# Altium footprint library connector.PcbLib: 138 footprints (part 9 of 9)
Each footprint in its own frame and in the unit in brackets; x right, y up, seen from the top. Pads: shape width x height; smd on the part's side, far side on the other; paste and mask are expansions set on the pad; w line width, h text height; cw(c..) or ccw(c..) is an arc to the next point about the centre after c.
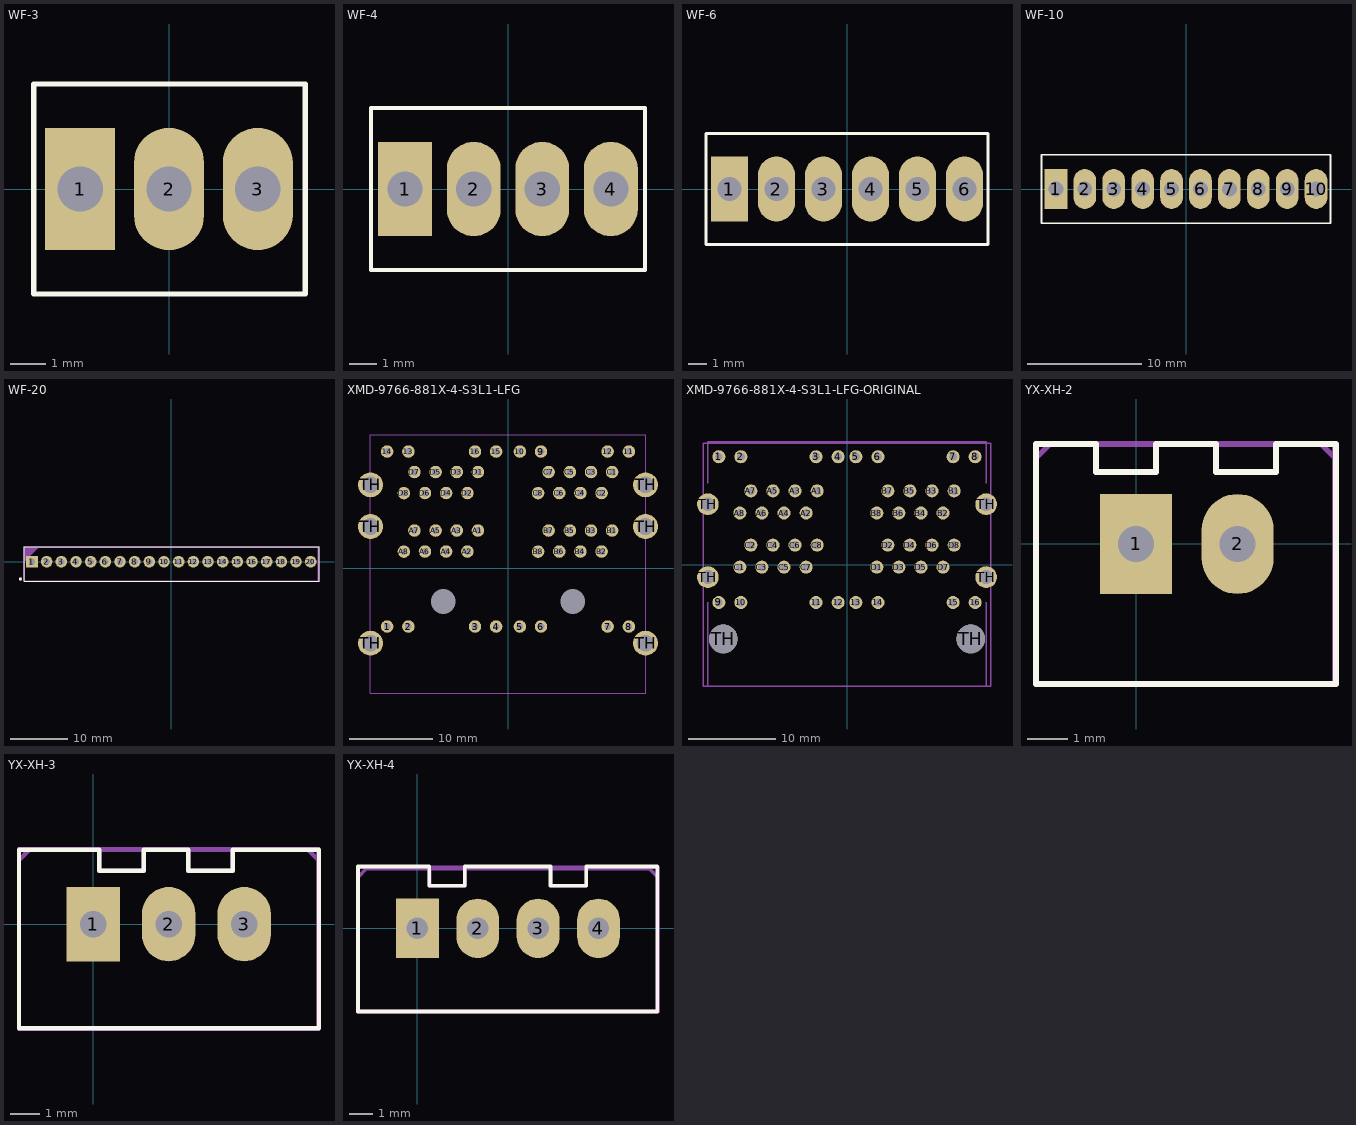
[diagram p8: the footprints below, top view; thin cyan lines are the x and y axes]

## WF-3 [mm]
pads (3):
  rect 2x3.5 hole 1.3: 1(-2.54,0)
  oval 2x3.5 hole 1.3: 2(0,0) 3(2.54,0)
Top Overlay:
  lines w0.15: -3.87,-3 3.9,-3 3.9,3 -3.87,3 -3.87,-3
3D body "SNP389.STEP": height 11.4, standoff -3.4, extent -3.81,-2.9 -1.27,2.9
3D body "SNP389.STEP": height 11.4, standoff -3.4, extent -1.27,-2.9 1.27,2.9
3D body "SNP389.STEP": height 11.4, standoff -3.4, extent 1.27,-2.9 3.81,2.9

## WF-4 [mm]
pads (4):
  rect 2x3.5 hole 1.3: 1(-3.81,0)
  oval 2x3.5 hole 1.3: 2(-1.27,0) 3(1.27,0) 4(3.81,0)
Top Overlay:
  lines w0.15: -5.08,-3 -5.08,3 5.08,3 5.08,-3 -5.08,-3
3D body "SNP389.STEP": height 11.4, standoff -3.4, extent 2.54,-2.9 5.08,2.9
3D body "SNP389.STEP": height 11.4, standoff -3.4, extent 0,-2.9 2.54,2.9
3D body "SNP389.STEP": height 11.4, standoff -3.4, extent -2.54,-2.9 0,2.9
3D body "SNP389.STEP": height 11.4, standoff -3.4, extent -5.08,-2.9 -2.54,2.9

## WF-6 [mm]
pads (6):
  rect 2x3.5 hole 1.3: 1(-6.35,0)
  oval 2x3.5 hole 1.3: 2(-3.81,0) 3(-1.27,0) 4(1.27,0) 5(3.81,0) 6(6.35,0)
Top Overlay:
  lines w0.15: -7.62,-3 7.62,-3 7.62,3 -7.62,3 -7.62,-3
3D body "SNP389.STEP": height 11.4, standoff -3.4, extent 5.08,-2.9 7.62,2.9
3D body "SNP389.STEP": height 11.4, standoff -3.4, extent 2.54,-2.9 5.08,2.9
3D body "SNP389.STEP": height 11.4, standoff -3.4, extent -7.62,-2.9 -5.08,2.9
3D body "SNP389.STEP": height 11.4, standoff -3.4, extent -5.08,-2.9 -2.54,2.9
3D body "SNP389.STEP": height 11.4, standoff -3.4, extent -2.54,-2.9 0,2.9
3D body "SNP389.STEP": height 11.4, standoff -3.4, extent 0,-2.9 2.54,2.9

## WF-10 [mm]
pads (10):
  rect 2x3.5 hole 1.3: 1(-11.43,0)
  oval 2x3.5 hole 1.3: 2(-8.89,0) 3(-6.35,0) 4(-3.81,0) 5(-1.27,0) 6(1.27,0) 7(3.81,0) 8(6.35,0) 9(8.89,0) 10(11.43,0)
Top Overlay:
  lines w0.15: -12.7,-3 -12.7,3 12.7,3 12.7,-3 -12.7,-3
3D body "SNP389.STEP": height 11.4, standoff -3.4, extent 10.16,-2.9 12.7,2.9
3D body "SNP389.STEP": height 11.4, standoff -3.4, extent 7.62,-2.9 10.16,2.9
3D body "SNP389.STEP": height 11.4, standoff -3.4, extent 5.08,-2.9 7.62,2.9
3D body "SNP389.STEP": height 11.4, standoff -3.4, extent 2.54,-2.9 5.08,2.9
3D body "SNP389.STEP": height 11.4, standoff -3.4, extent -5.08,-2.9 -2.54,2.9
3D body "SNP389.STEP": height 11.4, standoff -3.4, extent -7.62,-2.9 -5.08,2.9
3D body "SNP389.STEP": height 11.4, standoff -3.4, extent -10.16,-2.9 -7.62,2.9
3D body "SNP389.STEP": height 11.4, standoff -3.4, extent -12.7,-2.9 -10.16,2.9
3D body "SNP389.STEP": height 11.4, standoff -3.4, extent -2.54,-2.9 0,2.9
3D body "SNP389.STEP": height 11.4, standoff -3.4, extent 0,-2.9 2.54,2.9

## WF-20 [mm]
pads (22):
  round 0.5 on Top Overlay: 0(-26.13,-3)
  round 0.5 on Mech29: 0(-26.13,-3)
  rect 2x2 hole 1.1: 1(-24.13,0)
  round 2 hole 1.1: 2(-21.59,0) 3(-19.05,0) 4(-16.51,0) 5(-13.97,0) 6(-11.43,0) 7(-8.89,0) 8(-6.35,0) 9(-3.81,0) 10(-1.27,0) 11(1.27,0) 12(3.81,0) 13(6.35,0) 14(8.89,0) 15(11.43,0) 16(13.97,0) 17(16.51,0) 18(19.05,0) 19(21.59,0) 20(24.13,0)
Top Overlay:
  lines w0.15: -25.48,-3.4 -25.48,2.6 25.57,2.6 25.57,-3.4 -25.48,-3.4
Mechanical 1:
  lines w0.15: -25.37,-3.3 25.47,-3.3 25.47,2.5 -25.37,2.5 -25.37,-3.3
Mechanical 29:
  region: -25.48,2.6 -22.88,2.6 -25.48,0
  lines w0.15: -25.48,-3.4 25.57,-3.4 25.57,2.6 -25.48,2.6 -25.48,-3.4
  text ".Designator" at -3.5,-0.3 h1
3D body "WF-20.stp": height 11.51, standoff -3.29, extent -25.37,-3.3 25.47,2.5

## XMD-9766-881X-4-S3L1-LFG [mm]
pads (56):
  round 1.5 hole 0.8: 1(-14.5,-7) 2(-11.96,-7) 3(-3.96,-7) 4(-1.42,-7) 5(1.42,-7) 6(3.96,-7) 7(11.96,-7) 8(14.5,-7) 9(3.96,14) 10(1.42,14) 11(14.5,14) 12(11.96,14) 13(-11.96,14) 14(-14.5,14) 15(-1.42,14) 16(-3.96,14) A1(-3.61,4.52) A2(-4.88,2) A3(-6.15,4.52) A4(-7.42,2) A5(-8.69,4.52) A6(-9.96,2) A7(-11.23,4.52) A8(-12.5,1.98) B1(12.5,4.52) B2(11.23,2) B3(9.96,4.52) B4(8.69,2) B5(7.42,4.52) B6(6.15,2) B7(4.88,4.52) B8(3.61,1.98) C1(12.5,11.54) C2(11.23,9.02) C3(9.96,11.54) C4(8.69,9.02) C5(7.42,11.54) C6(6.15,9.02) C7(4.88,11.54) C8(3.61,9) D1(-3.61,11.54) D2(-4.88,9.02) D3(-6.15,11.54) D4(-7.42,9.02) D5(-8.69,11.54) D6(-9.96,9.02) D7(-11.23,11.54) D8(-12.5,9)
  round 0 hole 3: 4(-7.77,-4) 4(7.77,-4)
  round 3 hole 2: TH(-16.5,-9) TH(-16.5,5) TH(-16.5,10) TH(16.5,-9) TH(16.5,5) TH(16.5,10)
Mechanical 29:
  lines w0.15: -16.5,-15 16.5,-15 16.5,16 -16.5,16 -16.5,-15
  text ".Designator" at -3.5,-0.3 h1

## XMD-9766-881X-4-S3L1-LFG-ORIGINAL [mm]
height 25.4
pads (54):
  round 1.5 hole 0.9: 1(-14.74,12.44) 2(-12.2,12.44) 3(-3.56,12.44) 4(-1.02,12.44) 5(1.02,12.44) 6(3.56,12.44) 7(12.2,12.44) 8(14.74,12.44) 9(-14.74,-4.32) 10(-12.2,-4.32) 11(-3.56,-4.32) 12(-1.02,-4.32) 13(1.02,-4.32) 14(3.56,-4.32) 15(12.2,-4.32) 16(14.74,-4.32) A1(-3.435,8.51) A2(-4.705,5.97) A3(-5.975,8.51) A4(-7.245,5.97) A5(-8.515,8.51) A6(-9.785,5.97) A7(-11.055,8.51) A8(-12.325,5.97) B1(12.315,8.51) B2(11.045,5.97) B3(9.775,8.51) B4(8.505,5.97) B5(7.235,8.51) B6(5.965,5.97) B7(4.695,8.51) B8(3.425,5.97) C1(-12.325,-0.26) C2(-11.055,2.28) C3(-9.785,-0.26) C4(-8.515,2.28) C5(-7.245,-0.26) C6(-5.975,2.28) C7(-4.705,-0.26) C8(-3.435,2.28) D1(3.425,-0.26) D2(4.695,2.28) D3(5.965,-0.26) D4(7.235,2.28) D5(8.505,-0.26) D6(9.775,2.28) D7(11.045,-0.26) D8(12.315,2.28)
  round 2.5 hole 1.6: TH(-16,-1.4) TH(-16,6.98) TH(16,-1.4) TH(16,6.98)
  round 3.3 hole 3.3: TH(-14.225,-8.51) TH(14.225,-8.51)
Mechanical 29:
  lines w0.15: -16,-4.32 -16,-13.97 16,-13.97 16,-4.32 ; -16,9.4 -16,14.18 16,14.18 16,9.4 ; -16.51,-13.97 -16.51,13.97 16.51,13.97 16.51,-13.97 -16.51,-13.97
  text ".Designator" at -3.5,-0.3 h1

## YX-XH-2 [mm]
pads (2):
  rect 1.8x2.5 hole 0.9: 1(0,0)
  oval 1.8x2.5 hole 0.9: 2(2.54,0)
Top Overlay:
  lines w0.15: -2.5,-3.5 -2.5,2.5 -1,2.5 -1,1.8 0.5,1.8 0.5,2.5 2,2.5 2,1.8 3.5,1.8 3.5,2.5 5,2.5 5,-3.5 -2.5,-3.5
Mechanical 29:
  lines w0.15: -1,2.5 -1,1.8 0.5,1.8 0.5,2.5 ; 2,2.5 2,1.8 3.5,1.8 3.5,2.5 ; -2.5,-3.5 5,-3.5 5,2.125 4.625,2.5 -2.15,2.5 -2.5,2.15 -2.5,-3.5 ; -2.5,-3.5 4.975,-3.5 4.975,2.5 -2.5,2.5 -2.5,-3.5
  text ".Designator" at -2,-0.8 h1
3D body "User Library-CWF-2.step": height 7, standoff -3.5, extent -2.46,-3.55 5.04,2.2

## YX-XH-3 [mm]
pads (3):
  rect 1.8x2.5 hole 0.9: 1(0,0)
  oval 1.8x2.5 hole 0.9: 2(2.54,0) 3(5.08,0)
Top Overlay:
  lines w0.15: -2.5,-3.5 7.6,-3.5 7.6,2.5 4.7,2.5 4.7,1.8 3.2,1.8 3.2,2.5 1.7,2.5 1.7,1.8 0.2,1.8 0.2,2.5 -2.5,2.5 -2.5,-3.5
Mechanical 29:
  lines w0.15: -2.5,-2.1 -2.5,1.825 ; 0.2,2.5 0.2,1.8 1.7,1.8 1.7,2.5 ; 3.2,2.5 3.2,1.8 4.7,1.8 4.7,2.5 ; 7.575,2.525 -2.5,2.525 -2.5,-3.525 7.58,-3.525 7.58,2.525 ; 7.58,-2.1 7.58,1.825 ; -2.5,-3.5 7.58,-3.5 7.58,2.15 7.23,2.5 -2.15,2.5 -2.5,2.15 -2.5,-3.5
  text ".Designator" at -1,-1.3 h1
3D body "User Library-XH-3P_2_5_Silver.STEP": height 7, standoff -3.5, extent -2.4,-3.375 7.5,2.375

## YX-XH-4 [mm]
pads (4):
  rect 1.8x2.5 hole 0.9: 1(0,0)
  oval 1.8x2.5 hole 0.9: 2(2.54,0) 3(5.08,0) 4(7.62,0)
Top Overlay:
  lines w0.15: -2.5,-3.5 10.1,-3.5 10.1,2.6 7.1,2.6 7.1,1.8 5.6,1.8 5.6,2.6 2,2.6 2,1.8 0.5,1.8 0.5,2.6 -2.5,2.6 -2.5,-3.5
Mechanical 29:
  lines w0.15: -2.5,-2.1 -2.5,1.825 ; 0.51,2.5 0.51,1.8 2.01,1.8 2.01,2.5 ; 5.61,2.5 5.61,1.8 7.11,1.8 7.11,2.5 ; 10.12,-2.1 10.12,1.825 ; -2.5,-3.5 10.12,-3.5 10.12,2.15 9.77,2.5 -2.15,2.5 -2.5,2.15 -2.5,-3.5 ; -2.5,-3.5 -2.5,2.575 10.125,2.575 10.125,-3.5 -2.5,-3.5
  text ".Designator" at 0,-2.3 h1
3D body "User Library-HEADER JST BxB-XH-A.step": height 7, standoff -3.4, extent -2.4,-3.4 10,2.35